# Altium footprint library ALL.PcbLib: 385 footprints (part 21 of 25)
Each footprint in its own frame and in the unit in brackets; x right, y up, seen from the top. Pads: shape width x height; smd on the part's side, far side on the other; paste and mask are expansions set on the pad; w line width, h text height; cw(c..) or ccw(c..) is an arc to the next point about the centre after c.
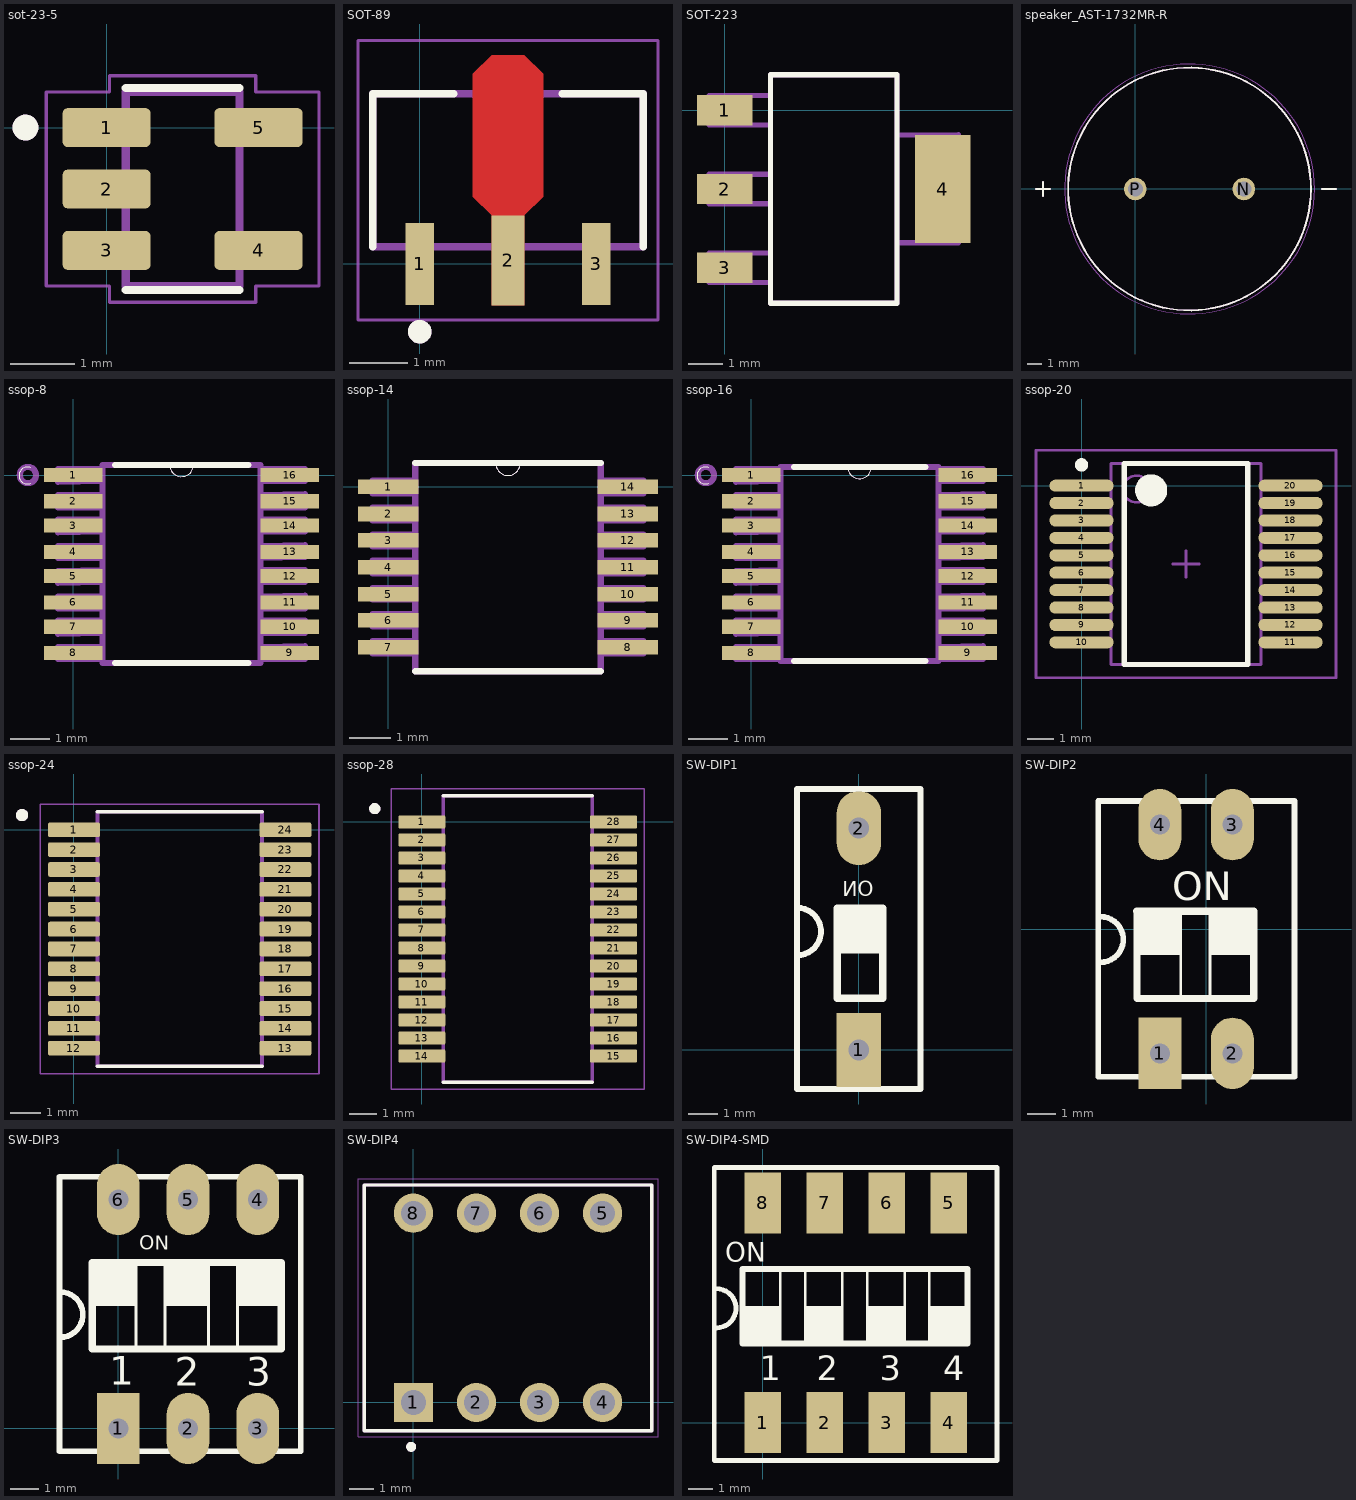
[diagram p20: the footprints below, top view; thin cyan lines are the x and y axes]

## sot-23-5 [mm]
pads (5):
  rrect25% 1.36x0.6 smd: 1(0,0) 2(0,-0.95) 3(0,-1.9) 4(2.35,-1.9) 5(2.35,0)
Top Overlay:
  circle w0.2: c-1.255,0 r0.1
  lines w0.127: 0.295,-2.514 2.055,-2.514 ; 0.295,0.614 2.055,0.614
Mechanical 13:
  circle w0.2: c-1.255,0 r0.1
  lines w0.127: 0.295,-2.45 0.295,0.55 2.055,0.55 2.055,-2.45 0.295,-2.45
Mechanical 15:
  lines w0.05: -0.935,-2.45 0.045,-2.45 0.045,-2.7 2.305,-2.7 2.305,-2.45 3.285,-2.45 3.285,0.55 2.305,0.55 2.305,0.8 0.045,0.8 0.045,0.55 -0.935,0.55 -0.935,-2.45
3D body "step_temp.STEP": height 1.45, standoff 0, extent -0.225,-2.4 2.575,0.5

## SOT-89 [mm]
pads (3):
  rect 0.48x1.4 smd: 1(-0.001,-0.003) 3(2.999,-0.003)
  rect 0.56x1.525 smd mask+0: 2(1.499,0.057)
Top Layer:
  region: 1.219,3.547 1.779,3.547 2.099,3.227 2.099,1.142 1.779,0.822 1.779,-0.703 1.219,-0.703 1.219,0.822 0.899,1.142 0.899,3.227
Top Overlay:
  circle w0.2: c-0.001,-1.153 r0.1
  lines w0.127: -0.801,0.292 -0.801,2.892 0.579,2.892 ; 2.419,2.892 3.799,2.892 3.799,0.292
Top Paste:
  region: 1.879,3.045 1.879,1.325 1.119,1.325 1.119,3.045
Top Solder:
  region: 1.219,3.647 1.779,3.647 2.199,3.227 2.199,1.142 1.879,0.822 1.879,-0.803 1.119,-0.803 1.119,0.822 0.799,1.142 0.799,3.227
Mechanical 13:
  circle w0.2: c-0.001,-1.153 r0.1
  lines w0.127: -0.801,0.292 -0.801,2.892 3.799,2.892 3.799,0.292 -0.801,0.292
Mechanical 15:
  lines w0.05: -1.051,-0.953 4.049,-0.953 4.049,3.797 -1.051,3.797 -1.051,-0.953
3D body "MB.STEP": height 1.2, standoff -0.4, extent -0.751,-0.718 3.749,3.377

## SOT-223 [mil]
pads (4):
  rect 64x35 smd: 1(0,0) 2(0,-91) 3(0,-182)
  rect 64x125 smd: 4(252,-91)
Top Overlay:
  lines w6: 53,-223 199,-223 199,41 53,41 53,-223
Mechanical 13:
  lines w6: -18,-199 -18,-165 53,-165 53,-199 -18,-199 ; -18,-108 -18,-74 53,-74 53,-108 -18,-108 ; -18,-17 -18,17 53,17 53,-17 -18,-17 ; 53,-223 199,-223 199,41 53,41 53,-223 ; 199,-153 199,-29 270,-28 270,-153 199,-153
3D body "DB.STEP": height 70.87, standoff 0, extent -11.74,-218.95 263.76,36.96

## speaker_AST-1732MR-R [mm]
pads (2):
  round 1.575 hole 1.05: N(7.6,-0.025) P(0,-0.025)
Top Overlay:
  circle w0.127: c3.8,-0.025 r8.5
  lines w0.127: -6.95,-0.025 -5.95,-0.025 ; -6.45,-0.525 -6.45,0.475 ; 13.05,-0.025 14.05,-0.025
Mechanical 13:
  circle w0.127: c3.8,-0.025 r8.5
  lines w0.127: -6.95,-0.025 -5.95,-0.025 ; -6.45,-0.525 -6.45,0.475 ; 13.05,-0.025 14.05,-0.025
Mechanical 15:
  circle w0.05: c3.8,-0.025 r8.75
3D body "step_temp.STEP": height 8, standoff -6.35, extent -4.69,-8.576 12.31,8.424

## ssop-8 [mil]
pads (16):
  rect 58x14 smd: 1(0,0) 2(0,-26) 3(0,-50) 4(0,-76) 5(0,-100) 6(0,-126) 7(0,-150) 8(0,-176) 9(214,-176) 10(214,-150) 11(214,-126) 12(214,-100) 13(214,-76) 14(214,-50) 15(214,-26) 16(214,0)
Top Overlay:
  lines w0: -42,-8 cw(c-45.5,-0.5) -42,7 ; 95,10.08 ccw(c107,10.5) 119,10.92
  lines w6: 41,-186 173,-186 ; 41,10 95,10 173,10
Mechanical 13:
  lines w0: 95,10.08 ccw(c107,10.5) 119,10.92
  lines w6: -53,0 ccw(c-45,0) -37,0 ccw(c-45,0) -53,0 ; -15,-182 -15,-170 29,-170 29,-182 -15,-182 ; -15,-157 -15,-144 29,-144 29,-156 -15,-157 ; -15,-132 -15,-120 29,-120 29,-132 -15,-132 ; -15,-107 -15,-95 29,-94 29,-106 -15,-107 ; -15,-82 -15,-70 29,-70 29,-82 -15,-82 ; -15,-57 -15,-44 29,-44 29,-56 -15,-57 ; -15,-32 -15,-20 29,-20 29,-32 -15,-32 ; -15,-7 -15,6 29,6 29,-6 -15,-7 ; 29,-186 185,-186 185,10 95,10 29,10 29,-186 ; 185,-182 185,-170 229,-169 229,-182 185,-182 ; 185,-156 185,-144 229,-144 229,-156 185,-156 ; 185,-132 185,-120 229,-119 229,-132 185,-132 ; 185,-106 185,-94 229,-94 229,-106 185,-106 ; 185,-82 185,-70 229,-69 229,-81 185,-82 ; 185,-56 185,-44 229,-44 229,-56 185,-56 ; 185,-32 185,-20 229,-19 229,-32 185,-32 ; 185,-6 185,6 229,6 229,-6 185,-6
3D body "NOPB.STEP": height 69, standoff 0, extent -10.99,-184.5 225.01,8.5

## ssop-14 [mil]
pads (14):
  rect 58x14 smd: 1(0,0) 2(0,-26) 3(0,-51) 4(0,-77) 5(0,-103) 6(0,-128) 7(0,-154) 8(230,-154) 9(230,-128) 10(230,-103) 11(230,-77) 12(230,-51) 13(230,-26) 14(230,0)
Top Overlay:
  lines w0: 103,23 ccw(c115,23) 127,23
  lines w6: 26,-177 204,-177 ; 26,23 103,23 127,23 204,23
Mechanical 13:
  lines w0: 103,23 ccw(c115,23) 127,23
  lines w6: -15,-160 26,-160 26,-148 -15,-148 -15,-160 ; -15,-134 26,-134 26,-122 -15,-122 -15,-134 ; -15,-108 26,-108 26,-97 -15,-97 -15,-108 ; -15,-83 26,-83 26,-71 -15,-71 -15,-83 ; -15,-57 26,-57 26,-46 -15,-46 -15,-57 ; -15,-32 26,-32 26,-20 -15,-20 -15,-32 ; -15,-6 26,-6 26,6 -15,6 -15,-6 ; 26,-177 26,23 103,23 127,23 204,23 204,-177 26,-177 ; 204,-160 245,-160 245,-148 204,-148 204,-160 ; 204,-134 245,-134 245,-122 204,-122 204,-134 ; 204,-108 245,-108 245,-97 204,-97 204,-108 ; 204,-83 245,-83 245,-71 204,-71 204,-83 ; 204,-57 245,-57 245,-46 204,-46 204,-57 ; 204,-32 245,-32 245,-20 204,-20 204,-32 ; 204,-6 245,-6 245,6 204,6 204,-6
3D body "User Library-SSOP14P-P065.STEP": height 68.22, standoff -3.3, extent -3.11,-177 233.11,19.85

## ssop-16 [mil]
pads (16):
  rect 58x14 smd: 1(0,0) 2(0,-26) 3(0,-50) 4(0,-76) 5(0,-100) 6(0,-126) 7(0,-150) 8(0,-176) 9(214,-176) 10(214,-150) 11(214,-126) 12(214,-100) 13(214,-76) 14(214,-50) 15(214,-26) 16(214,0)
Top Overlay:
  lines w0: -42,-8 cw(c-45.5,-0.5) -42,7 ; 95,8.08 ccw(c107,8.5) 119,8.92
  lines w6: 42,-184 172,-184 ; 42,8 95,8 172,8
Mechanical 13:
  lines w0: 95,8.08 ccw(c107,8.5) 119,8.92
  lines w6: -53,0 ccw(c-45,0) -37,0 ccw(c-45,0) -53,0 ; -15,-182 -15,-170 29,-170 29,-182 -15,-182 ; -15,-157 -15,-144 29,-144 29,-156 -15,-157 ; -15,-132 -15,-120 29,-120 29,-132 -15,-132 ; -15,-107 -15,-95 29,-94 29,-106 -15,-107 ; -15,-82 -15,-70 29,-70 29,-82 -15,-82 ; -15,-57 -15,-44 29,-44 29,-56 -15,-57 ; -15,-32 -15,-20 29,-20 29,-32 -15,-32 ; -15,-7 -15,6 29,6 29,-6 -15,-7 ; 29,-184 185,-184 185,8 95,8 29,8 29,-184 ; 185,-182 185,-170 229,-169 229,-182 185,-182 ; 185,-156 185,-144 229,-144 229,-156 185,-156 ; 185,-132 185,-120 229,-119 229,-132 185,-132 ; 185,-106 185,-94 229,-94 229,-106 185,-106 ; 185,-82 185,-70 229,-69 229,-81 185,-82 ; 185,-56 185,-44 229,-44 229,-56 185,-56 ; 185,-32 185,-20 229,-19 229,-32 185,-32 ; 185,-6 185,6 229,6 229,-6 185,-6
3D body "step_temp.STEP": height 69, standoff 0, extent -11,-184.5 225,8.5

## ssop-20 [mm]
pads (20):
  oval 2.4x0.45 smd: 1(0,0) 2(0,-0.65) 3(0,-1.3) 4(0,-1.95) 5(0,-2.6) 6(0,-3.25) 7(0,-3.9) 8(0,-4.55) 9(0,-5.2) 10(0,-5.85) 11(7.8,-5.85) 12(7.8,-5.2) 13(7.8,-4.55) 14(7.8,-3.9) 15(7.8,-3.25) 16(7.8,-2.6) 17(7.8,-1.95) 18(7.8,-1.3) 19(7.8,-0.65) 20(7.8,0)
Top Overlay:
  circle w0.6: c2.6,-0.175 r0.3
  circle w0.25: c0,0.775 r0.125
  lines w0.2: 1.6,-6.675 6.2,-6.675 6.2,0.825 1.6,0.825 1.6,-6.675
Mechanical 13:
  circle w0.1: c2.05,-0.125 r0.5
  lines w0.1: 1.1,-6.675 6.7,-6.675 6.7,0.825 1.1,0.825 1.1,-6.675
Mechanical 15:
  lines w0.1: 3.4,-2.925 4.4,-2.925 ; 3.9,-3.425 3.9,-2.425 ; -1.7,-7.175 9.5,-7.175 9.5,1.325 -1.7,1.325 -1.7,-7.175
3D body "User Library-SSOP 20 PIN.step": height 1.93, standoff -0.06, extent -0.05,-6.175 7.85,0.325

## ssop-24 [mm]
pads (24):
  rrect25% 1.7x0.48 smd: 1(0,0) 2(0,-0.65) 3(0,-1.3) 4(0,-1.95) 5(0,-2.6) 6(0,-3.25) 7(0,-3.9) 8(0,-4.55) 9(0,-5.2) 10(0,-5.85) 11(0,-6.5) 12(0,-7.15) 13(6.92,-7.15) 14(6.92,-6.5) 15(6.92,-5.85) 16(6.92,-5.2) 17(6.92,-4.55) 18(6.92,-3.9) 19(6.92,-3.25) 20(6.92,-2.6) 21(6.92,-1.95) 22(6.92,-1.3) 23(6.92,-0.65) 24(6.92,0)
Top Overlay:
  circle w0.2: c-1.7,0.48 r0.1
  lines w0.127: 0.77,-7.74 6.15,-7.74 ; 0.77,0.59 6.15,0.59
Mechanical 13:
  circle w0.2: c-1.7,0.48 r0.1
  lines w0.127: 0.77,-7.74 0.77,0.59 6.15,0.59 6.15,-7.74 0.77,-7.74
Mechanical 15:
  lines w0.05: -1.1,-7.99 -1.1,0.84 8.02,0.84 8.02,-7.99 -1.1,-7.99
3D body "step_temp.STEP": height 1.99, standoff 0, extent -0.427,-7.675 7.348,0.525

## ssop-28 [mm]
pads (28):
  rrect25% 1.7x0.48 smd: 1(0,0) 2(0,-0.65) 3(0,-1.3) 4(0,-1.95) 5(0,-2.6) 6(0,-3.25) 7(0,-3.9) 8(0,-4.55) 9(0,-5.2) 10(0,-5.85) 11(0,-6.5) 12(0,-7.15) 13(0,-7.8) 14(0,-8.45) 15(6.92,-8.45) 16(6.92,-7.8) 17(6.92,-7.15) 18(6.92,-6.5) 19(6.92,-5.85) 20(6.92,-5.2) 21(6.92,-4.55) 22(6.92,-3.9) 23(6.92,-3.25) 24(6.92,-2.6) 25(6.92,-1.95) 26(6.92,-1.3) 27(6.92,-0.65) 28(6.92,0)
Top Overlay:
  circle w0.2: c-1.7,0.48 r0.1
  lines w0.127: 0.77,-9.39 6.15,-9.39 ; 0.77,0.94 6.15,0.94
Mechanical 13:
  circle w0.2: c-1.7,0.48 r0.1
  lines w0.127: 0.77,-9.39 0.77,0.94 6.15,0.94 6.15,-9.39 0.77,-9.39
Mechanical 15:
  lines w0.05: -1.1,-9.64 -1.1,1.19 8.02,1.19 8.02,-9.64 -1.1,-9.64
3D body "MAX3245EEAI+.STEP": height 1.99, standoff 0, extent -0.427,-9.345 7.347,0.855

## ssop-32 [mm]

## SW-DIP1 [mm]
pads (2):
  rect 1.5x2.5 hole 0.7: 1(0,0)
  oval 1.5x2.5 hole 0.7: 2(0,7.5)
Top Overlay:
  region: -0.746,4.79 -0.746,3.265 0.81,3.265 0.81,4.79
  lines w0.2: -2.08,3.202 ccw(c-2.08,4.002) -2.08,4.802 ; -2.09,-1.32 -2.09,8.82 2.08,8.82 2.08,-1.32 -2.09,-1.32
  lines w0.25: -0.73,1.74 -0.73,4.79
  lines w0.254: -0.73,1.74 0.81,1.74 0.81,4.79 -0.73,4.79
  text "ON" at 0.5,5.2 h0.5
3D body "User Library-dips sith 1.step": height 7.33, standoff -2.14, extent -1.94,-1.11 1.885,8.64

## SW-DIP2 [mm]
pads (4):
  rect 1.5x2.5 hole 0.7: 1(-1.626,-4.343)
  oval 1.5x2.5 hole 0.7: 2(0.914,-4.343) 3(0.914,3.657) 4(-1.626,3.657)
Top Overlay:
  region: -2.442,0.627 -2.442,-0.898 -0.886,-0.898 -0.886,0.627
  region: 0.108,0.627 0.108,-0.898 1.664,-0.898 1.664,0.627
  lines w0.1: -0.896,-2.423 -0.896,0.597 ; 0.124,-2.423 0.124,0.597
  lines w0.2: -3.706,-1.161 ccw(c-3.706,-0.361) -3.706,0.439 ; -3.786,-5.163 3.084,-5.163 3.084,4.487 -3.786,4.487 -3.786,-5.163
  lines w0.25: -2.426,-2.423 -2.426,0.597
  lines w0.254: -2.442,0.627 1.664,0.627 1.664,-2.423 -2.426,-2.423
  text "ON" at -1.186,1.017 h1
3D body "dip2.STEP": height 6.91, standoff -1.79, extent -3.606,-5.373 2.894,4.627

## SW-DIP3 [mm]
pads (6):
  rect 1.5x2.5 hole 0.7: 1(0,0)
  oval 1.5x2.5 hole 0.7: 2(2.45,0) 3(4.9,0) 4(4.9,8.05) 5(2.45,8.05) 6(0,8.05)
Top Overlay:
  region: -0.932,5.84 -0.932,4.315 0.624,4.315 0.624,5.84
  region: 1.624,5.84 1.624,4.315 3.18,4.315 3.18,5.84
  region: 4.174,5.84 4.174,4.315 5.73,4.315 5.73,5.84
  lines w0.1: 0.62,2.79 0.62,5.81 ; 1.64,2.79 1.64,5.81 ; 3.17,2.79 3.17,5.81 ; 4.19,2.79 4.19,5.81
  lines w0.2: -2.05,3.202 ccw(c-2.05,4.002) -2.05,4.802 ; -2.07,-0.8 6.41,-0.8 6.41,8.85 -2.07,8.85 -2.07,-0.8
  lines w0.25: -0.92,2.79 -0.92,5.81
  lines w0.254: -0.932,5.84 5.73,5.84 5.73,2.79 -0.92,2.79
  text "3" at 4.5,1.495 h1
  text "2" at 1.98,1.495 h1
  text "1" at -0.33,1.535 h1
  text "ON" at 0.74,6.28 h0.5
3D body "User Library-switch 3.step": height 7, standoff -3.7, extent -1.904,-0.81 6.23,9.09

## SW-DIP4 [mm]
pads (8):
  rect 1.58x1.58 hole 1: 1(0,0)
  round 1.58 hole 1: 2(2.54,0) 3(5.08,0) 4(7.62,0) 5(7.62,7.62) 6(5.08,7.62) 7(2.54,7.62) 8(0,7.62)
Top Overlay:
  circle w0.2: c-0.09,-1.79 r0.1
  lines w0.127: -1.98,-1.14 -1.98,8.76 9.6,8.76 9.6,-1.14 -1.98,-1.14
Mechanical 13:
  circle w0.2: c-0.09,-1.79 r0.1
  lines w0.127: -1.98,-1.14 -1.98,8.76 9.6,8.76 9.6,-1.14 -1.98,-1.14
Mechanical 15:
  lines w0.05: -2.23,-1.39 -2.23,9.01 9.85,9.01 9.85,-1.39 -2.23,-1.39

## SW-DIP4-SMD [mm]
pads (8):
  rect 1.5x2.5 smd: 1(0,0) 2(2.54,0) 3(5.08,0) 4(7.62,0) 5(7.62,9) 6(5.08,9) 7(2.54,9) 8(0,9)
Top Overlay:
  region: 0.734,3.247 0.734,4.772 -0.822,4.772 -0.822,3.247
  region: 3.284,3.247 3.284,4.772 1.728,4.772 1.728,3.247
  region: 5.84,3.247 5.84,4.772 4.284,4.772 4.284,3.247
  region: 8.394,3.247 8.394,4.772 6.838,4.772 6.838,3.247
  lines w0.1: 0.718,3.277 0.718,6.297 ; 1.738,3.277 1.738,6.297 ; 3.268,3.277 3.268,6.297 ; 4.288,3.277 4.288,6.297 ; 5.828,3.277 5.828,6.297 ; 6.828,3.277 6.828,6.297
  lines w0.2: -1.89,3.882 ccw(c-1.89,4.683) -1.89,5.483 ; -1.981,-1.56 -1.981,10.46 9.601,10.46 9.601,-1.56 -1.981,-1.56
  lines w0.25: 8.388,6.297 8.394,6.297 8.394,3.247
  lines w0.254: 8.388,6.297 -0.822,6.297 -0.822,3.247 8.394,3.247
  text "ON" at -1.54,6.6 h0.8
  text "1" at -0.126,1.745 h1
  text "2" at 2.211,1.745 h1
  text "3" at 4.803,1.745 h1
  text "4" at 7.394,1.745 h1
3D body "User Library-SMD DIP-4 switch.step": height 4.9, standoff 0, extent -1.74,-0.44 9.36,9.36